# Altium footprint library MH_DA_THU_VIEN_16122016.PcbLib: 531 footprints (part 5 of 34)
Each footprint in its own frame and in the unit in brackets; x right, y up, seen from the top. Pads: shape width x height; smd on the part's side, far side on the other; paste and mask are expansions set on the pad; w line width, h text height; cw(c..) or ccw(c..) is an arc to the next point about the centre after c.
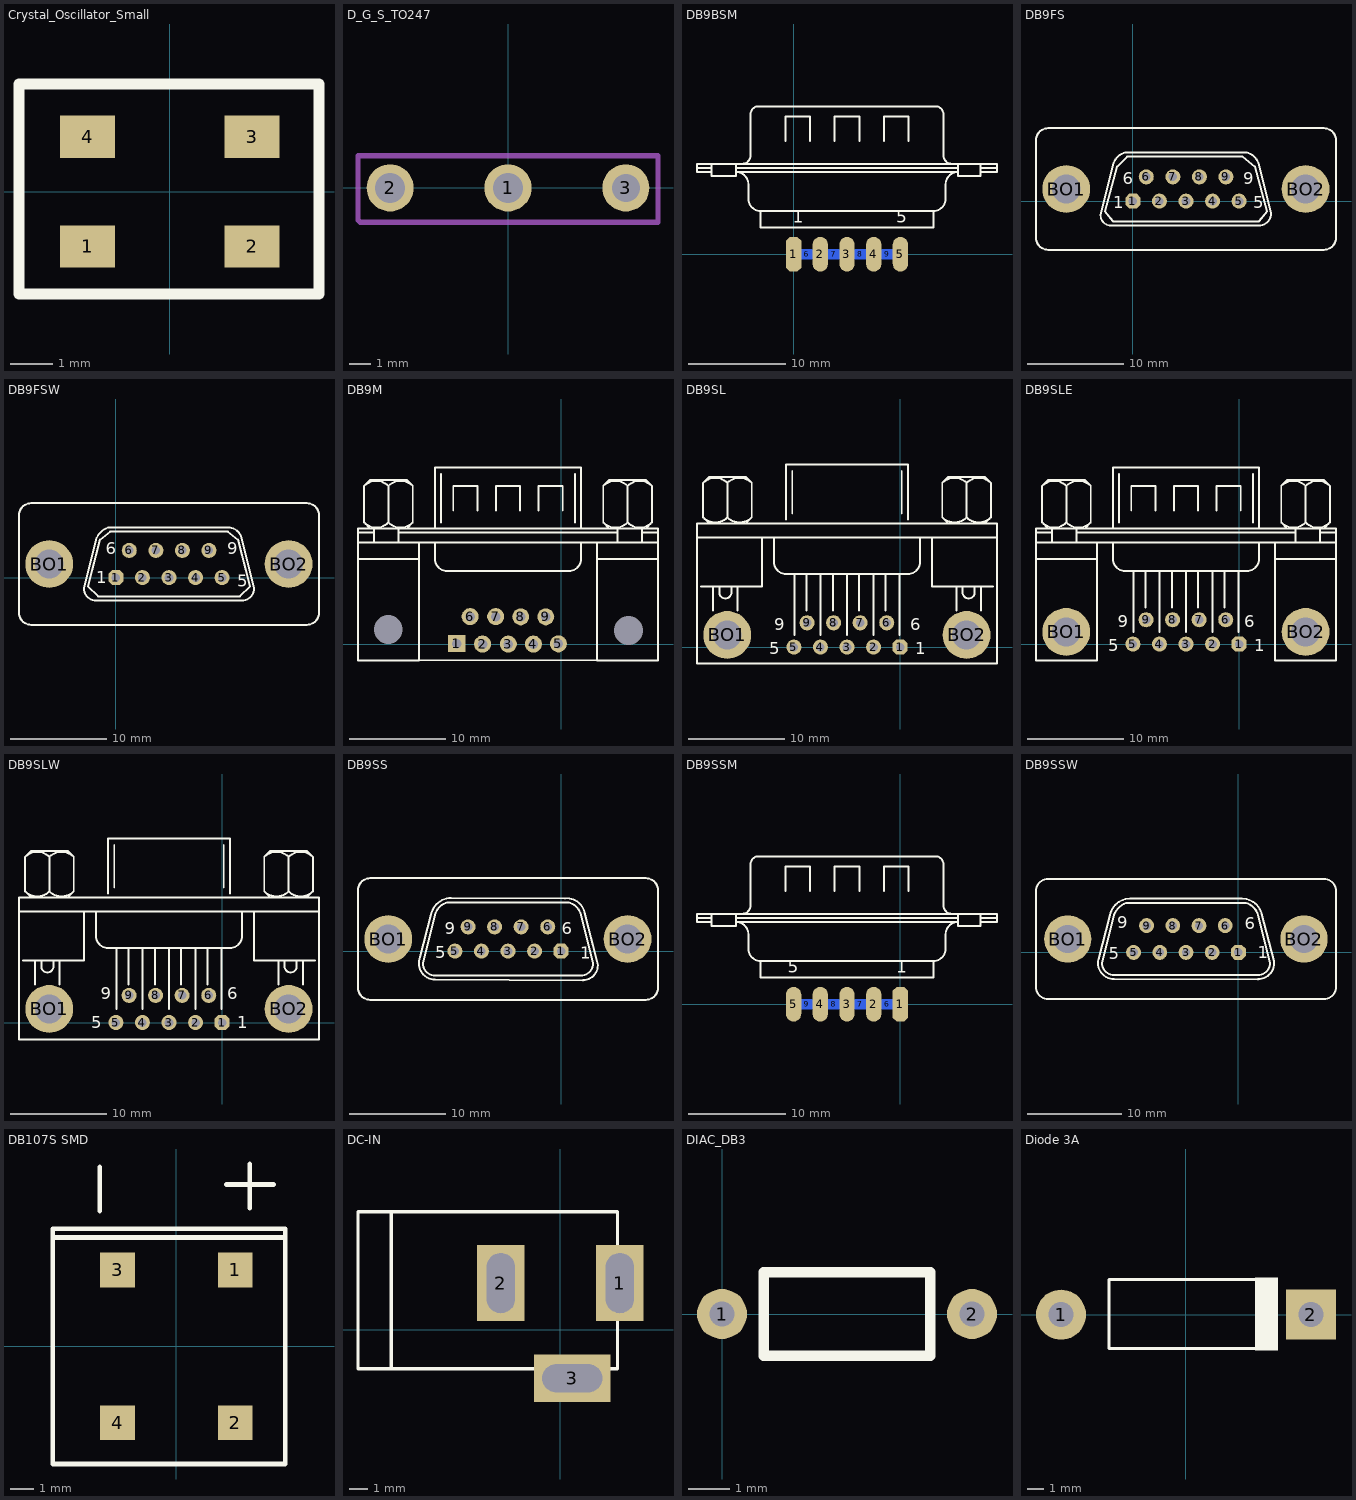
[diagram p4: the footprints below, top view; thin cyan lines are the x and y axes]

## Crystal_Oscillator_Small [mm]
pads (4):
  rect 1.3x1 smd: 1(-1.95,-1.3) 2(1.95,-1.3) 3(1.95,1.3) 4(-1.95,1.3)
Top Overlay:
  lines w0.254: -3.573,-2.43 3.534,-2.43 3.534,2.55 -3.573,2.55 -3.573,-2.43
3D body: height 1.31, standoff 0, extent -3.443,-2.419 3.557,2.581

## D_G_S_TO247 [mm]
pads (3):
  round 2.2 hole 1.4: 1(0,0) 2(-5.5,0)
  round 2.2 hole 1.3: 3(5.5,0)
Mechanical 1:
  lines w0.254: -7,-1.5 -6.9,-1.6 7,-1.6 7,1.5 -7,1.5 -7,-1.5

## DB9BSM [mm]
pads (9):
  oct 1.587x3.598 smd: 1(0,0)
  oval 1.587x3.598 smd: 2(2.752,0) 3(5.503,0) 4(8.255,0) 5(11.007,0)
  oval 2x1 smd far side: 6(1.376,0) 7(4.127,0) 8(6.879,0) 9(9.631,0)
Top Overlay:
  lines w0.203: -9.948,8.89 -8.467,8.89 ; -8.467,8.467 -9.948,8.467 -9.948,9.313 20.955,9.313 20.955,8.467 19.262,8.467 ; -8.467,9.313 -8.467,8.043 -5.927,8.043 -5.927,9.313 ; -5.927,8.89 16.933,8.89 ; -5.292,9.313 ccw(c-5.292,10.16) -4.445,10.16 -4.445,14.393 cw(c-3.598,14.393) -3.598,15.24 14.605,15.24 cw(c14.605,14.393) 15.452,14.393 15.452,10.16 ccw(c16.298,10.16) 16.298,9.313 ; -0.847,11.642 -0.847,14.182 1.693,14.182 1.693,11.642 ; 4.233,11.642 4.233,14.182 6.773,14.182 6.773,11.642 ; 9.313,11.642 9.313,14.182 11.853,14.182 11.853,11.642 ; 16.933,9.313 16.933,8.043 19.262,8.043 19.262,9.313 ; 19.262,8.89 20.955,8.89 ; -3.387,4.445 cw(c-3.387,5.715) -4.657,5.715 -4.657,7.197 ccw(c-5.927,7.197) -5.927,8.467 16.933,8.467 ccw(c16.933,7.197) 15.663,7.197 15.663,5.715 cw(c14.393,5.715) 14.393,4.445 ; -3.387,4.445 -3.387,2.752 14.393,2.752 14.393,4.445 ; -3.387,4.445 14.393,4.445
  text "1" at -0.085,3.26 h1.27
  text "5" at 10.583,3.26 h1.27

## DB9FS [mil]
pads (11):
  oct 62x62 hole 35: 1(0,0)
  round 62 hole 35: 2(109.17,0) 3(218.33,0) 4(327.5,0) 5(436.67,0) 6(55,100) 7(164.17,100) 8(273.33,100) 9(382.5,100)
  round 196.67 hole 118.33: BO1(-274.17,50) BO2(710,50)
Top Overlay:
  lines w8: -131.72,-50.22 ccw(c-90,-58.33) -81.89,-100.05 ; -131.67,-50 -81.67,150 ; -81.67,-100 518.33,-100 ccw(c518.33,-50) 568.33,-50 518.33,150 ; -81.3,149.86 cw(c-15,133.33) -31.53,199.64 ; -31.67,200 468.33,200 ; 468.2,199.64 cw(c451.67,133.33) 517.97,149.86 ; -398.33,-150 ccw(c-348.33,-150) -348.33,-200 785,-200 ccw(c785,-150) 835,-150 835,250 ccw(c785,250) 785,300 -348.33,300 ccw(c-348.33,250) -398.33,250 -398.33,-150 ; -115,-41.67 -81.67,-83.33 518.33,-83.33 551.67,-41.67 501.67,141.67 451.67,183.33 -23.33,183.33 -65,141.67 -115,-41.67
  text "9" at 454.03,70.2 h50
  text "6" at -41.67,70 h50
  text "5" at 494.63,-29.7 h50
  text "1" at -81.67,-30 h50

## DB9FSW [mil]
pads (11):
  oct 62x62 hole 35: 1(0,0)
  round 62 hole 35: 2(109.17,0) 3(218.33,0) 4(327.5,0) 5(436.67,0) 6(55,111.67) 7(164.17,111.67) 8(273.33,111.67) 9(382.5,111.67)
  round 196.67 hole 118.33: BO1(-274.17,55.83) BO2(710,55.83)
Top Overlay:
  lines w8: -398.33,255.83 cw(c-348.33,255.83) -348.33,305.83 785,305.83 cw(c785,255.83) 835,255.83 835,-144.17 cw(c785,-144.17) 785,-194.17 -348.33,-194.17 cw(c-348.33,-144.17) -398.33,-144.17 -398.33,264.17 ; -81.67,155.83 -131.67,-44.17 ccw(c-81.67,-44.17) -81.67,-94.17 518.33,-94.17 ccw(c518.33,-44.17) 568.33,-44.17 518.33,155.83 ; -78.99,163.03 cw(c-6.67,130.83) -31.13,206.12 ; -31.67,205.83 468.33,205.83 ; 468.23,206.09 cw(c460,147.5) 518.59,155.73 ; -115,-35.83 -65,155.83 -23.33,189.17 460,189.17 501.67,155.83 551.67,-35.83 510,-77.5 -73.33,-77.5 -115,-35.83
  text "6" at -41.67,95.83 h50
  text "1" at -81.67,-24.17 h50
  text "5" at 499.33,-37.97 h50
  text "9" at 458.33,95.83 h50

## DB9M [mil]
pads (11):
  rect 70x70 hole 39.37 unplated: 1(-429,2)
  round 70 hole 39.37 unplated: 2(-323,0) 3(-217,0) 4(-114,0) 5(-11,1) 6(-374,113) 7(-269,113) 8(-166,112) 9(-63,112)
  round 70 hole 118.11 unplated: ""(-711,60) ""(277,56)
Top Overlay:
  lines w7.87: -619,-66.67 210,-66.67
  lines w8: -835,350 -585,350 ; -835,416.67 398.33,416.67 ; -835,458.33 -768.33,458.33 ; -810.09,499.91 ccw(c-760,550) -709.91,499.91 ; -810.09,650.09 cw(c-760,600) -709.91,650.09 ; -785,475 -810,500 -810,650 -785,675 -635,675 -610,650 -610,500 -635,475 ; -768.33,416.67 -768.33,475 ; -710.09,499.91 ccw(c-660,550) -609.91,499.91 ; -710.09,650.09 cw(c-660,600) -609.91,650.09 ; -710,500 -710,650 ; -668.33,416.67 -668.33,475 ; -668.33,458.33 231.67,458.33 ; -585,416.67 -585,-66.67 -835,-66.67 -835,475 398.33,475 398.33,-66.67 148.33,-66.67 148.33,416.67 ; -518.33,416.67 -518.33,350 ccw(c-468.33,350) -468.33,300 31.67,300 ccw(c31.67,350) 81.67,350 81.67,416.67 ; -518.33,475 -518.33,725 81.67,725 81.67,475 ; -493.33,500 -493.33,700 ; -443.33,550 -443.33,650 -343.33,650 -343.33,550 ; -268.33,550 -268.33,650 -168.33,650 -168.33,550 ; -93.33,550 -93.33,650 6.67,650 6.67,550 ; 56.67,500 56.67,700 ; 148.33,350 398.33,350 ; 173.25,499.91 ccw(c223.33,550) 273.42,499.91 ; 173.25,650.09 cw(c223.33,600) 273.42,650.09 ; 198.33,475 173.33,500 173.33,650 198.33,675 348.33,675 373.33,650 373.33,500 348.33,475 ; 231.67,416.67 231.67,475 ; 273.25,499.91 ccw(c323.33,550) 373.42,499.91 ; 273.25,650.09 cw(c323.33,600) 373.42,650.09 ; 273.33,500 273.33,650 ; 331.67,416.67 331.67,475 ; 331.67,458.33 398.33,458.33
3D body: height 447.45, standoff -199.2, extent -824.3,-61 388.3,663.41

## DB9SL [mil]
pads (11):
  oct 62x62 hole 35: 1(0,0)
  round 62 hole 35: 2(-109.17,0) 3(-218.33,0) 4(-327.5,0) 5(-436.67,0) 6(-55,100) 7(-164.17,100) 8(-273.33,100) 9(-382.5,100)
  round 196.67 hole 118.33: BO1(-710.83,50) BO2(273.33,50)
Top Overlay:
  lines w8: -835,450 398.33,450 ; -818.33,250 -568.33,250 -568.33,450 ; -810.09,533.25 ccw(c-760,583.33) -709.91,533.25 ; -810.09,675.09 cw(c-760,625) -709.91,675.09 ; -785,508.33 -810,533.33 -810,675 -785,700 -635,700 -610,675 -610,533.33 -635,508.33 ; -768.33,150 -768.33,250 ; -743.33,250 -743.33,225 ccw(c-718.33,225) -693.33,225 -693.33,250 ; -710.09,533.25 ccw(c-660,583.33) -609.91,533.25 ; -710.09,675.09 cw(c-660,625) -609.91,675.09 ; -710,533.33 -710,675 ; -668.33,150 -668.33,250 ; -518.33,450 -518.33,350 ccw(c-468.33,350) -468.33,300 31.67,300 ccw(c31.67,350) 81.67,350 81.67,450 ; -468.33,525 -468.33,750 31.67,750 31.67,525 ; -443.33,550 -443.33,725 ; -435,50 -435,300 ; -385,150 -385,300 ; -326.67,50 -326.67,300 ; -276.67,150 -276.67,300 ; -218.33,50 -218.33,300 ; -168.33,150 -168.33,300 ; -110,50 -110,300 ; -60,150 -60,158.33 -60,300 ; -1.67,50 -1.67,300 ; 6.67,550 6.67,725 ; 131.67,450 131.67,250 381.67,250 ; 173.25,533.25 ccw(c223.33,583.33) 273.42,533.25 ; 173.25,675.09 cw(c223.33,625) 273.42,675.09 ; 198.33,508.33 173.33,533.33 173.33,675 198.33,700 348.33,700 373.33,675 373.33,533.33 348.33,508.33 ; 231.67,150 231.67,250 ; 256.67,250 256.67,225 ccw(c281.67,225) 306.67,225 306.67,250 ; 273.25,533.25 ccw(c323.33,583.33) 373.42,533.25 ; 273.25,675.09 cw(c323.33,625) 373.42,675.09 ; 273.33,533.33 273.33,675 ; 331.67,150 331.67,250 ; -835,-66.67 398.33,-66.67 398.33,508.33 -835,508.33 -835,-66.67
  text "6" at 41.67,70 h50
  text "1" at 61.67,-30 h50
  text "5" at -538.33,-30 h50
  text "9" at -518.33,70 h50

## DB9SLE [mil]
pads (11):
  oct 62x62 hole 35: 1(0,0)
  round 62 hole 35: 2(-109.17,0) 3(-218.33,0) 4(-327.5,0) 5(-436.67,0) 6(-55,100) 7(-164.17,100) 8(-273.33,100) 9(-382.5,100)
  round 196.67 hole 118.33: BO1(-710.83,50) BO2(273.33,50)
Top Overlay:
  lines w8: -835,350 -585,350 ; -835,416.67 398.33,416.67 ; -835,458.33 -768.33,458.33 ; -810.09,499.91 ccw(c-760,550) -709.91,499.91 ; -810.09,650.09 cw(c-760,600) -709.91,650.09 ; -785,475 -810,500 -810,650 -785,675 -635,675 -610,650 -610,500 -635,475 ; -768.33,416.67 -768.33,475 ; -710.09,499.91 ccw(c-660,550) -609.91,499.91 ; -710.09,650.09 cw(c-660,600) -609.91,650.09 ; -710,500 -710,650 ; -668.33,416.67 -668.33,475 ; -668.33,458.33 231.67,458.33 ; -585,416.67 -585,-66.67 -835,-66.67 -835,475 398.33,475 398.33,-66.67 148.33,-66.67 148.33,416.67 ; -518.33,416.67 -518.33,350 ccw(c-468.33,350) -468.33,300 31.67,300 ccw(c31.67,350) 81.67,350 81.67,416.67 ; -518.33,475 -518.33,725 81.67,725 81.67,475 ; -493.33,500 -493.33,700 ; -443.33,550 -443.33,650 -343.33,650 -343.33,550 ; -435,50 -435,300 ; -385,150 -385,300 ; -326.67,50 -326.67,300 ; -276.67,150 -276.67,300 ; -268.33,550 -268.33,650 -168.33,650 -168.33,550 ; -218.33,50 -218.33,300 ; -168.33,150 -168.33,300 ; -110,50 -110,300 ; -93.33,550 -93.33,650 6.67,650 6.67,550 ; -60,150 -60,300 ; -1.67,50 -1.67,300 ; 56.67,500 56.67,700 ; 148.33,350 398.33,350 ; 173.25,499.91 ccw(c223.33,550) 273.42,499.91 ; 173.25,650.09 cw(c223.33,600) 273.42,650.09 ; 198.33,475 173.33,500 173.33,650 198.33,675 348.33,675 373.33,650 373.33,500 348.33,475 ; 231.67,416.67 231.67,475 ; 273.25,499.91 ccw(c323.33,550) 373.42,499.91 ; 273.25,650.09 cw(c323.33,600) 373.42,650.09 ; 273.33,500 273.33,650 ; 331.67,416.67 331.67,475 ; 331.67,458.33 398.33,458.33
  text "1" at 61.67,-30 h50
  text "6" at 21.67,70 h50
  text "5" at -538.33,-30 h50
  text "9" at -498.33,70 h50

## DB9SLW [mil]
pads (11):
  oct 62x62 hole 35: 1(0,0)
  round 62 hole 35: 2(-109.17,0) 3(-218.33,0) 4(-327.5,0) 5(-436.67,0) 6(-55,111.67) 7(-164.17,111.67) 8(-273.33,111.67) 9(-382.5,111.67)
  round 196.67 hole 118.33: BO1(-710.83,55.83) BO2(273.33,55.83)
Top Overlay:
  lines w8: -835,455.83 398.33,455.83 ; -818.33,255.83 -568.33,255.83 -568.33,455.83 ; -810.09,539.08 ccw(c-760,589.17) -709.91,539.08 ; -810.09,680.92 cw(c-760,630.83) -709.91,680.92 ; -785,514.17 -810,539.17 -810,680.83 -785,705.83 -635,705.83 -610,680.83 -610,539.17 -635,514.17 ; -768.33,155.83 -768.33,255.83 ; -743.33,255.83 -743.33,230.83 ccw(c-718.33,230.83) -693.33,230.83 -693.33,255.83 ; -710.09,539.08 ccw(c-660,589.17) -609.91,539.08 ; -710.09,680.92 cw(c-660,630.83) -609.91,680.92 ; -710,539.17 -710,680.83 ; -668.33,155.83 -668.33,255.83 ; -518.33,455.83 -518.33,355.83 ccw(c-468.33,355.83) -468.33,305.83 31.67,305.83 ccw(c31.67,355.83) 81.67,355.83 81.67,455.83 ; -468.33,530.83 -468.33,755.83 31.67,755.83 31.67,530.83 ; -443.33,555.83 -443.33,730.83 ; -435,55.83 -435,305.83 ; -385,155.83 -385,305.83 ; -326.67,55.83 -326.67,305.83 ; -276.67,155.83 -276.67,305.83 ; -218.33,55.83 -218.33,305.83 ; -168.33,155.83 -168.33,305.83 ; -110,55.83 -110,305.83 ; -60,155.83 -60,305.83 ; -1.67,55.83 -1.67,305.83 ; 6.67,555.83 6.67,730.83 ; 131.67,455.83 131.67,255.83 381.67,255.83 ; 173.25,539.08 ccw(c223.33,589.17) 273.42,539.08 ; 173.25,680.92 cw(c223.33,630.83) 273.42,680.92 ; 198.33,514.17 173.33,539.17 173.33,680.83 198.33,705.83 348.33,705.83 373.33,680.83 373.33,539.17 348.33,514.17 ; 231.67,155.83 231.67,255.83 ; 256.67,255.83 256.67,230.83 ccw(c281.67,230.83) 306.67,230.83 306.67,255.83 ; 273.25,539.08 ccw(c323.33,589.17) 373.42,539.08 ; 273.25,680.92 cw(c323.33,630.83) 373.42,680.92 ; 273.33,539.17 273.33,680.83 ; 331.67,155.83 331.67,255.83 ; -835,-69.17 -835,514.17 398.33,514.17 398.33,-69.17 -835,-69.17
  text "9" at -498.33,95.83 h50
  text "5" at -538.33,-24.17 h50
  text "1" at 61.67,-24.17 h50
  text "6" at 21.67,95.83 h50

## DB9SS [mil]
pads (11):
  oct 62x62 hole 35: 1(0,0)
  round 62 hole 35: 2(-109.17,0) 3(-218.33,0) 4(-327.5,0) 5(-436.67,0) 6(-55,100) 7(-164.17,100) 8(-273.33,100) 9(-382.5,100)
  round 196.67 hole 118.33: BO1(-710.83,50) BO2(273.33,50)
Top Overlay:
  lines w8: -580,-23.33 -535,150 ; -579.7,-23.95 ccw(c-518.33,-50) -518.33,-116.67 90,-120 ; -535.1,149.55 cw(c-451.67,133.33) -451.67,218.33 15,216.67 ; -518.33,150 -568.33,-50 ccw(c-518.33,-50) -518.33,-100 81.67,-100 ccw(c81.67,-50) 131.67,-50 81.67,150 ; -517.97,149.86 cw(c-451.67,133.33) -468.2,199.64 ; -468.33,200 31.67,200 ; 15.41,217.08 cw(c23.33,141.67) 97.22,158.72 ; 31.53,199.64 cw(c15,133.33) 81.3,149.86 ; 90,-119.17 ccw(c90,-58.33) 148.48,-41.57 ; 96.67,158.33 148.33,-41.67 ; -835,-150 ccw(c-785,-150) -785,-200 348.33,-200 ccw(c348.33,-150) 398.33,-150 398.33,250 ccw(c348.33,250) 348.33,300 -785,300 ccw(c-785,250) -835,250 -835,-150
  text "6" at 1.67,70 h50
  text "1" at 78.27,-31.3 h50
  text "5" at -518.33,-30 h50
  text "9" at -478.33,70 h50

## DB9SSM [mm]
pads (9):
  oct 1.587x3.598 smd: 1(0,0)
  oval 1.587x3.598 smd: 2(-2.752,0) 3(-5.503,0) 4(-8.255,0) 5(-11.007,0)
  oval 2x1 smd far side: 6(-1.376,0) 7(-4.127,0) 8(-6.879,0) 9(-9.631,0)
Top Overlay:
  lines w0.203: -20.955,8.89 -19.473,8.89 ; -19.473,8.467 -20.955,8.467 -20.955,9.313 9.948,9.313 9.948,8.467 8.255,8.467 ; -19.473,9.313 -19.473,8.043 -16.933,8.043 -16.933,9.313 ; -16.933,8.89 5.927,8.89 ; -16.298,9.313 ccw(c-16.298,10.16) -15.452,10.16 -15.452,14.393 cw(c-14.605,14.393) -14.605,15.24 3.598,15.24 cw(c3.598,14.393) 4.445,14.393 4.445,10.16 ccw(c5.292,10.16) 5.292,9.313 ; -11.853,11.642 -11.853,14.182 -9.313,14.182 -9.313,11.642 ; -6.773,11.642 -6.773,14.182 -4.233,14.182 -4.233,11.642 ; -1.693,11.642 -1.693,14.182 0.847,14.182 0.847,11.642 ; 5.927,9.313 5.927,8.043 8.255,8.043 8.255,9.313 ; 8.255,8.89 9.948,8.89 ; -14.393,4.445 cw(c-14.393,5.715) -15.663,5.715 -15.663,7.197 ccw(c-16.933,7.197) -16.933,8.467 5.927,8.467 ccw(c5.927,7.197) 4.657,7.197 4.657,5.715 cw(c3.387,5.715) 3.387,4.445 ; -14.393,4.445 -14.393,2.752 3.387,2.752 3.387,4.445 ; -14.393,4.445 3.387,4.445
  text "5" at -11.599,3.26 h1.27
  text "1" at -0.423,3.26 h1.27

## DB9SSW [mil]
pads (11):
  oct 62x62 hole 35: 1(0,0)
  round 62 hole 35: 2(-109.17,0) 3(-218.33,0) 4(-327.5,0) 5(-436.67,0) 6(-55,111.67) 7(-164.17,111.67) 8(-273.33,111.67) 9(-382.5,111.67)
  round 196.67 hole 118.33: BO1(-710.83,55.83) BO2(273.33,55.83)
Top Overlay:
  lines w8: -583.33,-29.17 -535,155.83 ; -583.02,-28.04 ccw(c-518.33,-44.17) -518.33,-110.83 81.67,-112.5 ; -535.1,155.38 cw(c-451.67,139.17) -451.67,224.17 15,224.17 cw(c15,139.17) 96.29,164.02 ; -518.45,156.21 cw(c-435,122.5) -468.71,205.95 ; -518.33,155.83 -568.33,-44.17 ccw(c-518.33,-44.17) -518.33,-94.17 81.67,-94.17 ccw(c81.67,-44.17) 131.67,-44.17 81.67,155.83 ; -468.33,205.83 31.67,205.83 ; 31.53,205.47 cw(c15,139.17) 81.3,155.7 ; 81.67,-111.67 ccw(c81.67,-44.17) 148.66,-35.94 ; 96.67,162.5 148.33,-35.83 ; -843.33,-144.17 ccw(c-793.33,-144.17) -793.33,-194.17 356.67,-194.17 ccw(c356.67,-144.17) 406.67,-144.17 406.67,255.83 ccw(c356.67,255.83) 356.67,305.83 -793.33,305.83 ccw(c-793.33,255.83) -843.33,255.83 -843.33,-144.17
  text "6" at 27.27,95.73 h50
  text "1" at 81.07,-24.47 h50
  text "5" at -540.83,-29.27 h50
  text "9" at -504.43,100.53 h50

## DB107S SMD [mm]
pads (4):
  rect 1.5x1.5 smd: 1(2.54,3.302) 2(2.54,-3.302) 3(-2.54,3.302) 4(-2.54,-3.302)
Top Overlay:
  lines w0.203: -5.334,4.699 4.699,4.699 ; -3.302,5.842 -3.302,7.747 ; 2.159,6.985 4.191,6.985 ; 3.175,5.969 3.175,7.874 ; -5.334,-5.08 4.699,-5.08 4.699,5.08 -5.334,5.08 -5.334,-5.08

## DC-IN [mil]
pads (3):
  rect 100x160 hole 59.06 slot 125.98 at 90 deg: 1(125,98) 2(-125,98)
  rect 160x100 hole 59.06 slot 125.98 at 0 deg: 3(25,-102)
Top Overlay:
  lines w7: -355,-82 -355,248 ; -425,-82 -425,248 120,248 120,-82 -425,-82
3D body: height 433.67, standoff -137.2, extent -410.35,-107.12 134,267.12

## DIAC_DB3 [mm]
pads (2):
  round 1.2 hole 0.6: 1(0,0) 2(6,0)
Top Overlay:
  lines w0.254: 1,-1 1,1 5,1 5,-1 1,-1

## Diode 3A [mil]
pads (2):
  round 120 hole 60: 1(-299.5,0)
  rect 120x120 hole 60: 2(299.5,0)
Top Overlay:
  rectangle: 165.5,-86 220.5,89
  lines w7.87: 215.5,-66 200.5,-81 -184.5,-81 -184.5,84 195.5,84 215.5,64
3D body: height 248.03, standoff -92.52, extent -319.36,-105.33 322.37,103.34